# Altium schematic symbol library AD_Lib.SchLib: 1239 symbols (part 1 of 9)
Pins are listed as number, name and electrical type; pins without a type are passive.

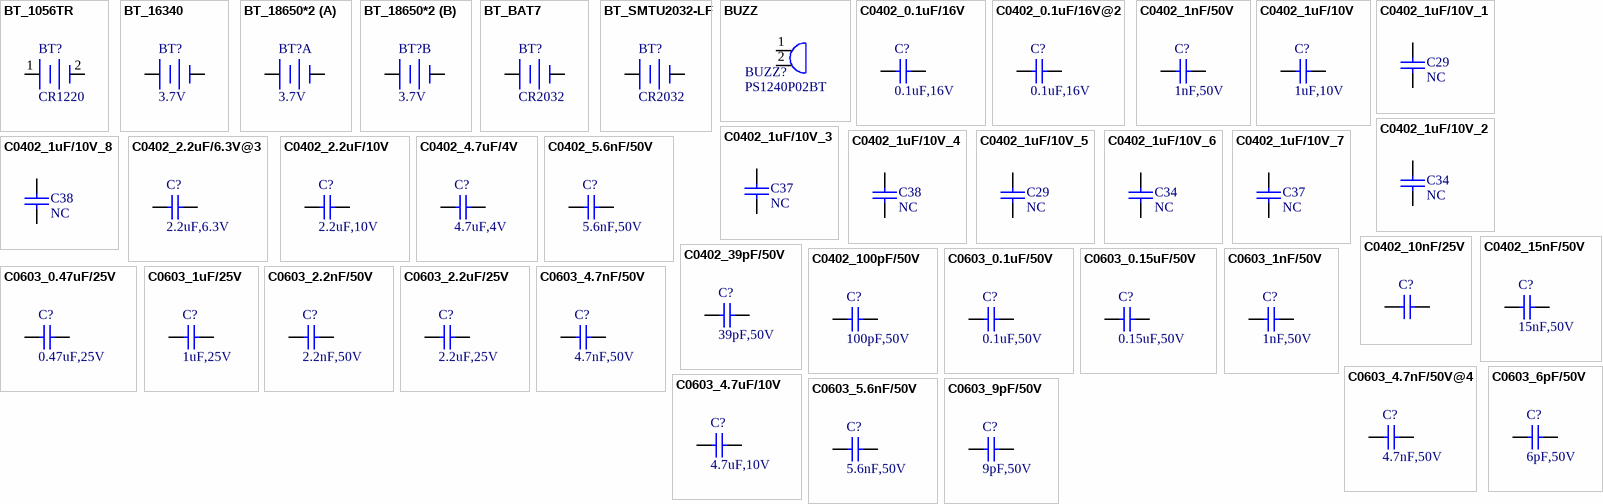
[diagram p0: symbols BT_1056TR to C0603_9pF/50V]

## BT_1056TR
designator BT?, comment CR1220
µç³Ø×ù; CR1220; Manufacturer: Keystone; pro-environment: RoHS; Quality: -40~100¡æ; OPN: 1056TR; other: Æ¥Åäµç³ØÎªCR1220; PadsNum: 2; Value: CR1220; SN: SN; Category: Á¬½ÓÆ÷; Part: 1056TR; QTY: 500; Price: 15.1983; OPN_JLC: 1056TR; SN_JLC: C238068; Price_JLC: 7.638
footprint J_1056TR (ï®µç³Ø»ù×ù£¬¶ÔÓ¦ï®µç³ØCR1220)
pins: 1 +, 2 -
2 alternate drawings of the same symbol

## BT_16340
designator BT?, comment 3.7V
ï®µç³Ø16340;1½Ú;3.7V; pro-environment: RoHS; Quality: -40~100¡æ; OPN: 16340; other: Æ¥Åäµç³ØÎª16340; PadsNum: 2; Value: 3.7V; SN: SN; Category: Á¬½ÓÆ÷; Part: 16340; Price: 3.2; OPN_JLC: OPN_JLC; SN_JLC: SN_JLC; Price_JLC: 0
footprint BT_16340 (16340µç³Ø×ù£¬1½Ú)
pins: 1 +, 2 -
2 alternate drawings of the same symbol

## BT_18650*2
designator BT?, comment 3.7V
ï®µç³Ø18650;2½Ú;3.7V; Manufacturer: ÔÆ»Ô; Part: 18650; pro-environment: RoHS; Quality: -40~100¡æ; OPN: 18650*2; other: Æ¥Åäµç³ØÎª18650; PadsNum: 4; Value: 3.7V; SN: SN; Category: Á¬½ÓÆ÷; Price: 3.2; OPN_JLC: OPN_JLC; SN_JLC: SN_JLC; Price_JLC: 0
footprint BT_18650*2 (Footprint not found)
part A pins: 1 +, 2 -
part B pins: 3 +, 4 -
2 alternate drawings of the same symbol

## BT_BAT7
designator BT?, comment CR2032
µç³Ø×ù; Manufacturer: Renata; pro-environment: RoHS; Quality: -40~100¡æ; SN: 03.4.99.25.99203201S; OPN: SMTU2032-LF; other: Æ¥Åäµç³ØÎªCR2032; PadsNum: 2; Value: CR2032; Category: Á¬½ÓÆ÷; Part: SMTU2032-LF; Price: ?; OPN_JLC: OPN_JLC; SN_JLC: SN_JLC; Price_JLC: 0
footprint SMTU2032-LF (ï®µç³Ø»ù×ù£¬¶ÔÓ¦ï®µç³ØCR2032MFR)
pins: 1 +, 2 -
2 alternate drawings of the same symbol

## BT_SMTU2032-LF
designator BT?, comment CR2032
µç³Ø×ù;CR2032; Manufacturer: Renata; pro-environment: RoHS; Quality: -40~100¡æ; SN: 03.4.99.25.99203201S; OPN: SMTU2032-LF; other: Æ¥Åäµç³ØÎªCR2032; PadsNum: 2; Value: CR2032; Category: Á¬½ÓÆ÷; Part: SMTU2032-LF; Price: ?; OPN_JLC: OPN_JLC; SN_JLC: SN_JLC; Price_JLC: 0
footprint SMTU2032-LF (ï®µç³Ø»ù×ù£¬¶ÔÓ¦ï®µç³ØCR2032MFR)
pins: 1 +, 2 -
2 alternate drawings of the same symbol

## BUZZ
designator BUZZ?, comment PS1240P02BT
PadsNum: 2; OPN: PS1240P02BT; Category: ·äÃùÆ÷; OPN_JLC: OPN_JLC; SN_JLC: SN_JLC; Price_JLC: 0
footprint BUZZ
pins: 1, 2

## C0402_0.1uF/16V
designator C?, comment 0.1uF,16V
ÌùÆ¬µçÈÝ; Manufacturer: Murata; pro-environment: RoHS; Quality: -55~125¡æ; SN: 03.4.37.18.15010402S; other: 0.1uF,16V,10%; OPN: GCM155R71C104KA55D; PadsNum: 2; Category: µçÈÝ; Part: GCM155R71C104KA55D; Value: 0.1uF,16V; QTY: 10000; Price: 0.05031; OPN_JLC: CL05B104KO5NNNC; SN_JLC: C1525; Price_JLC: 0
footprint C0402 (ÌùÆ¬µçÈÝ£¬ÄÍÑ¹10V)
pins: 1, 2

## C0402_0.1uF/16V@2
designator C?, comment 0.1uF,16V
ÌùÆ¬µçÈÝ; Manufacturer: Panasonic; pro-environment: RoHS; Quality: -55~125¡æ; other: 0.1uF,16V,10%; OPN: ???; PadsNum: 2; SN: -; Category: µçÈÝ; Part: ???; Value: 0.1uF,16V; Price: ?; OPN_JLC: CL05B104KO5NNNC; SN_JLC: C1525; Price_JLC: 0
footprint C0402 (ÌùÆ¬µçÈÝ£¬ÄÍÑ¹10V)
pins: 1, 2

## C0402_1nF/50V
designator C?, comment 1nF,50V
ÌùÆ¬µçÈÝ; Manufacturer: Murata; pro-environment: RoHS; Quality: -55~125¡æ; SN: 03.4.37.18.15010201S; other: 1nF,50V,10%; OPN: GCM155R71H102KA37D; PadsNum: 2; Category: µçÈÝ; Part: GCM155R71H102KA37D; Value: 1nF,50V; QTY: 10000; Price: 0.03042; OPN_JLC: 0402B102K500NT; SN_JLC: C1523; Price_JLC: 0
footprint C0402 (ÌùÆ¬µçÈÝ£¬ÄÍÑ¹10V)
pins: 1, 2

## C0402_1uF/10V
designator C?, comment 1uF,10V
ÌùÆ¬µçÈÝ; Manufacturer: Murata; pro-environment: RoHS; Quality: -55~125¡æ; other: 1uF,10V,10%; OPN: GCM155C71A105KE38D; PadsNum: 2; SN: SN; Category: µçÈÝ; Part: GCM155C71A105KE38D; Value: 1uF,10V; QTY: 10000; Price: 0.14577; OPN_JLC: OPN_JLC; SN_JLC: SN_JLC; Price_JLC: 0
footprint C0402 (ÌùÆ¬µçÈÝ£¬ÄÍÑ¹10V)
pins: 1, 2

## C0402_1uF/10V_1
designator C29, comment NC
ÌùÆ¬µçÈÝ; Manufacturer: Murata; pro-environment: RoHS; Quality: -55~125¡æ; other: 1uF,10V,10%; OPN: GCM155C71A105KE38D; SN: SN; Category: µçÈÝ; Part: GCM155C71A105KE38D; Value: NC; QTY: 10000; Price: 0.14577; OPN_JLC: OPN_JLC; SN_JLC: SN_JLC
footprint 0402B
pins: 1, 2

## C0402_1uF/10V_2
designator C34, comment NC
ÌùÆ¬µçÈÝ; Manufacturer: Murata; pro-environment: RoHS; Quality: -55~125¡æ; other: 1uF,10V,10%; OPN: GCM155C71A105KE38D; SN: SN; Category: µçÈÝ; Part: GCM155C71A105KE38D; Value: NC; QTY: 10000; Price: 0.14577; OPN_JLC: OPN_JLC; SN_JLC: SN_JLC
footprint 0402B
pins: 1, 2

## C0402_1uF/10V_3
designator C37, comment NC
ÌùÆ¬µçÈÝ; Manufacturer: Murata; pro-environment: RoHS; Quality: -55~125¡æ; other: 1uF,10V,10%; OPN: GCM155C71A105KE38D; SN: SN; Category: µçÈÝ; Part: GCM155C71A105KE38D; Value: NC; QTY: 10000; Price: 0.14577; OPN_JLC: OPN_JLC; SN_JLC: SN_JLC
footprint 0402B
pins: 1, 2

## C0402_1uF/10V_4
designator C38, comment NC
ÌùÆ¬µçÈÝ; Manufacturer: Murata; pro-environment: RoHS; Quality: -55~125¡æ; other: 1uF,10V,10%; OPN: GCM155C71A105KE38D; SN: SN; Category: µçÈÝ; Part: GCM155C71A105KE38D; Value: NC; QTY: 10000; Price: 0.14577; OPN_JLC: OPN_JLC; SN_JLC: SN_JLC
footprint 0402B
pins: 1, 2

## C0402_1uF/10V_5
designator C29, comment NC
ÌùÆ¬µçÈÝ; Manufacturer: Murata; pro-environment: RoHS; Quality: -55~125¡æ; other: 1uF,10V,10%; OPN: GCM155C71A105KE38D; SN: SN; Category: µçÈÝ; Part: GCM155C71A105KE38D; Value: NC; QTY: 10000; Price: 0.14577; OPN_JLC: OPN_JLC; SN_JLC: SN_JLC
footprint 0402B
pins: 1, 2

## C0402_1uF/10V_6
designator C34, comment NC
ÌùÆ¬µçÈÝ; Manufacturer: Murata; pro-environment: RoHS; Quality: -55~125¡æ; other: 1uF,10V,10%; OPN: GCM155C71A105KE38D; SN: SN; Category: µçÈÝ; Part: GCM155C71A105KE38D; Value: NC; QTY: 10000; Price: 0.14577; OPN_JLC: OPN_JLC; SN_JLC: SN_JLC
footprint 0402B
pins: 1, 2

## C0402_1uF/10V_7
designator C37, comment NC
ÌùÆ¬µçÈÝ; Manufacturer: Murata; pro-environment: RoHS; Quality: -55~125¡æ; other: 1uF,10V,10%; OPN: GCM155C71A105KE38D; SN: SN; Category: µçÈÝ; Part: GCM155C71A105KE38D; Value: NC; QTY: 10000; Price: 0.14577; OPN_JLC: OPN_JLC; SN_JLC: SN_JLC
footprint 0402B
pins: 1, 2

## C0402_1uF/10V_8
designator C38, comment NC
ÌùÆ¬µçÈÝ; Manufacturer: Murata; pro-environment: RoHS; Quality: -55~125¡æ; other: 1uF,10V,10%; OPN: GCM155C71A105KE38D; SN: SN; Category: µçÈÝ; Part: GCM155C71A105KE38D; Value: NC; QTY: 10000; Price: 0.14577; OPN_JLC: OPN_JLC; SN_JLC: SN_JLC
footprint 0402B
pins: 1, 2

## C0402_2.2uF/6.3V@3
designator C?, comment 2.2uF,6.3V
ÌùÆ¬µçÈÝ; Manufacturer: Yageo; pro-environment: RoHS; Quality: -55~85¡æ; SN: 03.4.37.18.15022501S; other: 2.2uF,6.3V,10%; OPN: CC0402KRX5R5BB225; PadsNum: 2; Category: µçÈÝ; Part: CC0402KRX5R5BB225; Value: 2.2uF,6.3V; QTY: 10000; Price: ?; OPN_JLC: OPN_JLC; SN_JLC: SN_JLC; Price_JLC: 0
footprint C0402 (ÌùÆ¬µçÈÝ£¬ÄÍÑ¹10V)
pins: 1, 2

## C0402_2.2uF/10V
designator C?, comment 2.2uF,10V
ÌùÆ¬µçÈÝ; Manufacturer: Murata; pro-environment: RoHS; Quality: -55~125¡æ; SN: 03.4.37.18.15022502S; other: 2.2uF,10V,10%; OPN: GRM155C71A225KE11D; PadsNum: 2; Category: µçÈÝ; Part: GRM155C71A225KE11D; Value: 2.2uF,10V; QTY: 10000; Price: ?; OPN_JLC: OPN_JLC; SN_JLC: SN_JLC; Price_JLC: 0
footprint C0402 (ÌùÆ¬µçÈÝ£¬ÄÍÑ¹10V)
pins: 1, 2

## C0402_4.7uF/4V
designator C?, comment 4.7uF,4V
ÌùÆ¬µçÈÝ; Manufacturer: Murata; pro-environment: RoHS; Quality: -55~125¡æ; other: 4.7uF,4V,20%; OPN: GRM155R60G475ME47D; PadsNum: 2; SN: SN; Category: µçÈÝ; Part: GRM155R60G475ME47D; Value: 4.7uF,4V; QTY: 10000; Price: 0.1695; OPN_JLC: OPN_JLC; SN_JLC: SN_JLC; Price_JLC: 0
footprint C0402 (ÌùÆ¬µçÈÝ£¬ÄÍÑ¹10V)
pins: 1, 2

## C0402_5.6nF/50V
designator C?, comment 5.6nF,50V
ÌùÆ¬µçÈÝ; Manufacturer: Murata; pro-environment: RoHS; Quality: -55~125¡æ; other: 5.6nF,50V,5%; OPN: GCM155R71H562JA55D; PadsNum: 2; SN: SN; Category: µçÈÝ; Part: GCM155R71H562JA55D; Value: 5.6nF,50V; QTY: 10000; Price: 0.06102; OPN_JLC: OPN_JLC; SN_JLC: SN_JLC; Price_JLC: 0
footprint C0402 (ÌùÆ¬µçÈÝ£¬ÄÍÑ¹10V)
pins: 1, 2

## C0402_10nF/25V
designator C?, comment 10nF,25V  (value not drawn)
ÌùÆ¬µçÈÝ; Manufacturer: Murata; pro-environment: RoHS; Quality: -55~125¡æ; SN: 03.4.37.18.15010301S; other: 10nF,25V,10%; OPN: GCM155R71E103KA37D; PadsNum: 2; Category: µçÈÝ; Part: GCM155R71E103KA37D; Value: 10nF,25V; Price: ?; OPN_JLC: CL05B103KB5NNNC; SN_JLC: C15195; Price_JLC: 0
footprint C0402 (ÌùÆ¬µçÈÝ£¬ÄÍÑ¹10V)
pins: 1, 2

## C0402_15nF/50V
designator C?, comment 15nF,50V
ÌùÆ¬µçÈÝ; Manufacturer: Murata; pro-environment: RoHS; Quality: -55~125¡æ; other: 15nF,50V,5%; OPN: GCM155R71H153JA55D; PadsNum: 2; SN: SN; Category: µçÈÝ; Part: GCM155R71H153JA55D; Value: 15nF,50V; QTY: 10000; Price: 0.09266; OPN_JLC: OPN_JLC; SN_JLC: SN_JLC; Price_JLC: 0
footprint C0402 (ÌùÆ¬µçÈÝ£¬ÄÍÑ¹10V)
pins: 1, 2

## C0402_39pF/50V
designator C?, comment 39pF,50V
ÌùÆ¬µçÈÝ; Manufacturer: Murata; pro-environment: RoHS; Quality: -55~125¡æ; other: 39pF,50V,5%; OPN: GCM1555C1H390JA16D; PadsNum: 2; SN: SN; Category: µçÈÝ; Part: GCM1555C1H390JA16D; Value: 39pF,50V; QTY: 10000; Price: 0.08475; OPN_JLC: OPN_JLC; SN_JLC: SN_JLC; Price_JLC: 0
footprint C0402 (ÌùÆ¬µçÈÝ£¬ÄÍÑ¹10V)
pins: 1, 2

## C0402_100pF/50V
designator C?, comment 100pF,50V
ÌùÆ¬µçÈÝ; Manufacturer: Murata; pro-environment: RoHS; Quality: -55~125¡æ; other: 100pF,50V,5%; OPN: GCM1555C1H101JA16D; PadsNum: 2; SN: SN; Category: µçÈÝ; Part: GCM1555C1H101JA16D; Value: 100pF,50V; QTY: 10000; Price: 0.06893; OPN_JLC: OPN_JLC; SN_JLC: SN_JLC; Price_JLC: 0
footprint C0402 (ÌùÆ¬µçÈÝ£¬ÄÍÑ¹10V)
pins: 1, 2

## C0603_0.1uF/50V
designator C?, comment 0.1uF,50V
ÌùÆ¬µçÈÝ; Manufacturer: Murata; pro-environment: RoHS; Quality: -55~125¡æ; other: 0.1uF,50V,10%; OPN: GCM188R71H104KA57D; PadsNum: 2; SN: SN; Category: µçÈÝ; Part: GCM188R71H104KA57D; Value: 0.1uF,50V; QTY: 4000; Price: ?; OPN_JLC: CC0603KRX7R9BB104; SN_JLC: C14663; Price_JLC: 0.014
footprint C0603 (¹«ÖÆ1608£»Ó¢ÖÆ0603)
pins: 1, 2

## C0603_0.15uF/50V
designator C?, comment 0.15uF,50V
ÌùÆ¬µçÈÝ; Manufacturer: Murata; pro-environment: RoHS; Quality: -55~125¡æ; other: 0.15uF,50V,10%; OPN: GCM188R71H154KA64D; PadsNum: 2; SN: SN; Category: µçÈÝ; Part: GCM188R71H154KA64D; Value: 0.15uF,50V; QTY: 4000; Price: 0.2106; OPN_JLC: OPN_JLC; SN_JLC: SN_JLC; Price_JLC: 0
footprint C0603 (¹«ÖÆ1608£»Ó¢ÖÆ0603)
pins: 1, 2

## C0603_0.47uF/25V
designator C?, comment 0.47uF,25V
ÌùÆ¬µçÈÝ; Manufacturer: Murata; pro-environment: RoHS; Quality: -55~125¡æ; other: 0.47uF,25V,10%; OPN: GCM188R71E474KA64D; PadsNum: 2; SN: SN; Category: µçÈÝ; Part: GCM188R71E474KA64D; Value: 0.47uF,25V; QTY: 4000; Price: ?; OPN_JLC: OPN_JLC; SN_JLC: SN_JLC; Price_JLC: 0
footprint C0603 (¹«ÖÆ1608£»Ó¢ÖÆ0603)
pins: 1, 2

## C0603_1nF/50V
designator C?, comment 1nF,50V
ÌùÆ¬µçÈÝ; Manufacturer: Murata; pro-environment: RoHS; Quality: -55~125¡æ; SN: 03.4.37.18.16010204S; other: 1nF,50V,10%; OPN: GCM188R71H102KA37D; PadsNum: 2; Category: µçÈÝ; Part: GCM188R71H102KA37D; Value: 1nF,50V; QTY: 4000; Price: 0.06201; OPN_JLC: CL10B102KB8NNNC; SN_JLC: C1588; Price_JLC: 0
footprint C0603 (¹«ÖÆ1608£»Ó¢ÖÆ0603)
pins: 1, 2

## C0603_1uF/25V
designator C?, comment 1uF,25V
ÌùÆ¬µçÈÝ; Manufacturer: Murata; pro-environment: RoHS; Quality: -55~125¡æ; other: 1uF,25V,10%; OPN: GCM188R71E105KA64D; PadsNum: 2; SN: SN; Category: µçÈÝ; Part: GCM188R71E105KA64D; Value: 1uF,25V; QTY: 4000; Price: ?; OPN_JLC: CL10A105KB8NNNC; SN_JLC: C15849; Price_JLC: 0
footprint C0603 (¹«ÖÆ1608£»Ó¢ÖÆ0603)
pins: 1, 2

## C0603_2.2nF/50V
designator C?, comment 2.2nF,50V
ÌùÆ¬µçÈÝ; Manufacturer: Murata; pro-environment: RoHS; Quality: -55~125¡æ; SN: 03.4.37.18.16022202S; other: 2.2nF,50V,10%; OPN: GCM188R71H222KA37D; PadsNum: 2; Category: µçÈÝ; Part: GCM188R71H222KA37D; Value: 2.2nF,50V; QTY: 4000; Price: 0.03861; OPN_JLC: 0603B222K500NT; SN_JLC: C1604; Price_JLC: 0
footprint C0603 (¹«ÖÆ1608£»Ó¢ÖÆ0603)
pins: 1, 2

## C0603_2.2uF/25V
designator C?, comment 2.2uF,25V
ÌùÆ¬µçÈÝ; Manufacturer: Murata; pro-environment: RoHS; Quality: -55~125¡æ; SN: 03.4.37.18.16022502S; other: 2.2uF,25V,10%; OPN: GRM188C71E225KE11D; PadsNum: 2; Category: µçÈÝ; Part: GRM188C71E225KE11D; Value: 2.2uF,25V; QTY: 4000; Price: -; OPN_JLC: CL10A225KO8NNNC; SN_JLC: C23630; Price_JLC: 0.03206
footprint C0603 (¹«ÖÆ1608£»Ó¢ÖÆ0603)
pins: 1, 2

## C0603_4.7nF/50V
designator C?, comment 4.7nF,50V
ÌùÆ¬µçÈÝ; Manufacturer: Murata; pro-environment: RoHS; Quality: -55~125¡æ; other: 4.7nF,50V,10%; OPN: GCM188R71H472KA37D; PadsNum: 2; SN: SN; Category: µçÈÝ; Part: GCM188R71H472KA37D; Value: 4.7nF,50V; QTY: 5000; Price: ?; OPN_JLC: 0603B472K500NT; SN_JLC: C53987; Price_JLC: 0
footprint C0603 (¹«ÖÆ1608£»Ó¢ÖÆ0603)
pins: 1, 2

## C0603_4.7nF/50V@4
designator C?, comment 4.7nF,50V
ÌùÆ¬µçÈÝ; Manufacturer: AVX; pro-environment: RoHS; Quality: -55~125¡æ; other: 4.7nF,50V,5%,X7R; OPN: 06035C472JAT2A; PadsNum: 2; SN: SN; Category: µçÈÝ; Part: 06035C472JAT2A; Value: 4.7nF,50V; QTY: 4000; Price: 0.18486; OPN_JLC: 0603B472K500NT; SN_JLC: C53987; Price_JLC: 0
footprint C0603 (¹«ÖÆ1608£»Ó¢ÖÆ0603)
pins: 1, 2

## C0603_4.7uF/10V
designator C?, comment 4.7uF,10V
ÌùÆ¬µçÈÝ; Manufacturer: Yageo; pro-environment: RoHS; Quality: -55~125¡æ; other: 4.7uF,6.3V,10%; OPN: GRM188Z71A475KE15J; PadsNum: 2; SN: SN; Category: µçÈÝ; Part: GRM188Z71A475KE15J; Value: 4.7uF,10V; QTY: 4000; Price: 0.47121; OPN_JLC: CL10A475KP8NNNC; SN_JLC: C1705; Price_JLC: 0.027966
footprint C0603 (¹«ÖÆ1608£»Ó¢ÖÆ0603)
pins: 1, 2

## C0603_5.6nF/50V
designator C?, comment 5.6nF,50V
ÌùÆ¬µçÈÝ; Manufacturer: Murata; pro-environment: RoHS; Quality: -55~125¡æ; other: 5.6nF,50V,5%,C0G; OPN: GRM1885C1H562JA01D; PadsNum: 2; SN: SN; Category: µçÈÝ; Part: GRM1885C1H562JA01D; Value: 5.6nF,50V; QTY: 4000; Price: 0.038139; OPN_JLC: CC0603KRX7R9BB562; SN_JLC: C107095; Price_JLC: 0.022469
footprint C0603 (¹«ÖÆ1608£»Ó¢ÖÆ0603)
pins: 1, 2

## C0603_6pF/50V
designator C?, comment 6pF,50V
ÌùÆ¬µçÈÝ; Manufacturer: Murata; pro-environment: RoHS; Quality: -55~125¡æ; other: 6pF,50V,5%; OPN: GCM1885C1H6R0CA16D; PadsNum: 2; SN: SN; Category: µçÈÝ; Part: GCM1885C1H6R0CA16D; Value: 6pF,50V; QTY: 4000; Price: 0.062083; OPN_JLC: CC0603CRNPO9BN6R0; SN_JLC: C130125; Price_JLC: 0.024606
footprint C0603 (¹«ÖÆ1608£»Ó¢ÖÆ0603)
pins: 1, 2

## C0603_9pF/50V
designator C?, comment 9pF,50V
ÌùÆ¬µçÈÝ; Manufacturer: Murata; pro-environment: RoHS; Quality: -55~125¡æ; SN: 03.4.37.18.1609R001S; other: 9pF,50V,0.5pF; PadsNum: 2; OPN: GCM1885C1H9R0DA16D; Category: µçÈÝ; Part: GCM1885C1H9R0DA16D; Value: 9pF,50V; QTY: 4000; Price: ?; OPN_JLC: OPN_JLC; SN_JLC: SN_JLC; Price_JLC: 0
footprint C0603 (¹«ÖÆ1608£»Ó¢ÖÆ0603)
pins: 1, 2

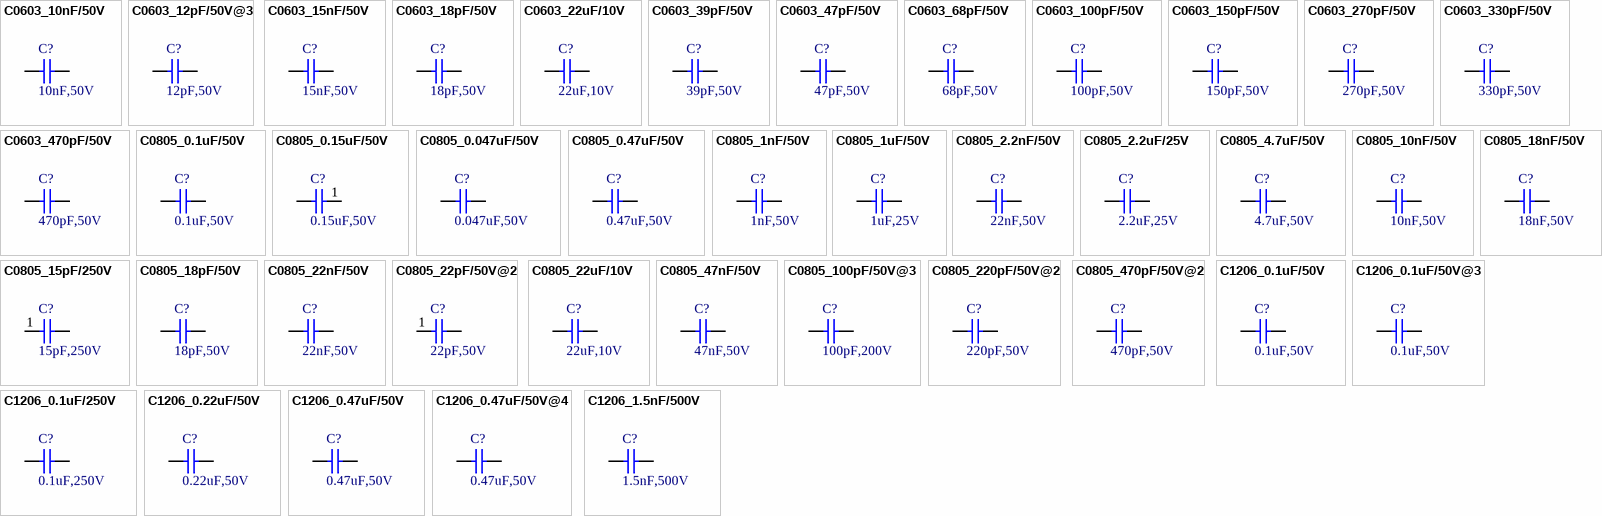
[diagram p1: symbols C0603_10nF/50V to C1206_1.5nF/500V]

## C0603_10nF/50V
designator C?, comment 10nF,50V
ÌùÆ¬µçÈÝ; Manufacturer: Murata; pro-environment: RoHS; Quality: -55~125¡æ; SN: 03.4.37.18.16010306S; other: 10nF,50V,10%; OPN: GCM188R71H103KA37D; PadsNum: 2; Category: µçÈÝ; Part: GCM188R71H103KA37D; Value: 10nF,50V; QTY: 4000; Price: ?; OPN_JLC: 0603B103K500NT; SN_JLC: C57112; Price_JLC: 0
footprint C0603 (¹«ÖÆ1608£»Ó¢ÖÆ0603)
pins: 1, 2

## C0603_12pF/50V@3
designator C?, comment 12pF,50V
ÌùÆ¬µçÈÝ; Manufacturer: Yageo; pro-environment: RoHS; Quality: -25~125¡æ; SN: 03.4.37.18.18012001S; other: 12pF,50V,2%; OPN: CC0603GRNPO9BN120; PadsNum: 2; Category: µçÈÝ; Part: CC0603GRNPO9BN120; Value: 12pF,50V; QTY: 4000; Price: 0.07254; OPN_JLC: CL10C120JB8NNNC; SN_JLC: C38523; Price_JLC: 0
footprint C0603 (¹«ÖÆ1608£»Ó¢ÖÆ0603)
pins: 1, 2

## C0603_15nF/50V
designator C?, comment 15nF,50V
ÌùÆ¬µçÈÝ; Manufacturer: Yageo; pro-environment: RoHS; Quality: -55~125¡æ; other: 15nF,50V,10%; OPN: CC0603KRX7R9BB153; PadsNum: 2; SN: SN; Category: µçÈÝ; Part: CC0603KRX7R9BB153; Value: 15nF,50V; QTY: 4000; Price: ?; OPN_JLC: CC0603KRX7R9BB153; SN_JLC: C107076; Price_JLC: 0.037665
footprint C0603 (¹«ÖÆ1608£»Ó¢ÖÆ0603)
pins: 1, 2

## C0603_18pF/50V
designator C?, comment 18pF,50V
ÌùÆ¬µçÈÝ; Manufacturer: Murata; pro-environment: RoHS; Quality: -55~125¡æ; other: 18pF,50V,1%; PadsNum: 2; OPN: GCM1885C1H180JA14D; SN: SN; Category: µçÈÝ; Part: GCM1885C1H180JA14D; Value: 18pF,50V; QTY: 4000; Price: -; OPN_JLC: CL10C180JB8NNNC; SN_JLC: C1647; Price_JLC: 0.033601
footprint C0603 (¹«ÖÆ1608£»Ó¢ÖÆ0603)
pins: 1, 2

## C0603_22uF/10V
designator C?, comment 22uF,10V
ÌùÆ¬µçÈÝ; Manufacturer: Murata; pro-environment: RoHS; Quality: -55~125¡æ; other: 22uF,10V,20%; OPN: GRM188R61A226ME15D; PadsNum: 2; SN: SN; Category: µçÈÝ; Part: GRM188R61A226ME15D; Value: 22uF,10V; QTY: 4000; Price: 0.162748; OPN_JLC: CL10A226MQ8NRNC; SN_JLC: C59461; Price_JLC: 0.071211
footprint C0603 (¹«ÖÆ1608£»Ó¢ÖÆ0603)
pins: 1, 2

## C0603_39pF/50V
designator C?, comment 39pF,50V
ÌùÆ¬µçÈÝ; Manufacturer: Murata; pro-environment: RoHS; Quality: -55~125¡æ; other: 39pF,50V,5%; OPN: GCM1885C1H390JA16D; PadsNum: 2; SN: SN; Category: µçÈÝ; Part: GCM1885C1H390JA16D; Value: 39pF,50V; QTY: 4000; Price: 0.07281; OPN_JLC: CC0603JRNPO9BN390; SN_JLC: C107049; Price_JLC: 0.013873
footprint C0603 (¹«ÖÆ1608£»Ó¢ÖÆ0603)
pins: 1, 2

## C0603_47pF/50V
designator C?, comment 47pF,50V
ÌùÆ¬µçÈÝ; Manufacturer: Murata; pro-environment: RoHS; Quality: -55~125¡æ; other: 47pF,50V,1%; PadsNum: 2; OPN: GQM1885C1H470FB01D; SN: SN; Category: µçÈÝ; Part: GQM1885C1H470FB01D; Value: 47pF,50V; QTY: 4000; Price: ?; OPN_JLC: CL10C470JB8NNNC; SN_JLC: C1671; Price_JLC: 0
footprint C0603 (¹«ÖÆ1608£»Ó¢ÖÆ0603)
pins: 1, 2

## C0603_68pF/50V
designator C?, comment 68pF,50V
ÌùÆ¬µçÈÝ; Manufacturer: Murata; pro-environment: RoHS; Quality: -25~125¡æ; SN: 03.4.37.18.16068002S; other: 68pF,50V,5%; OPN: GCM1885C1H680JA16D; PadsNum: 2; Category: µçÈÝ; Part: GCM1885C1H680JA16D; Value: 68pF,50V; QTY: 4000; Price: ?; OPN_JLC: CL10C680JB8NNNC; SN_JLC: C28262; Price_JLC: 0
footprint C0603 (¹«ÖÆ1608£»Ó¢ÖÆ0603)
pins: 1, 2

## C0603_100pF/50V
designator C?, comment 100pF,50V
ÌùÆ¬µçÈÝ; Manufacturer: Yageo; pro-environment: RoHS; Quality: -55~125¡æ; other: 100pF,50V,5%; OPN: CC0603JRNPO9BN101; PadsNum: 2; SN: SN; Category: µçÈÝ; Part: CC0603JRNPO9BN101; Value: 100pF,50V; QTY: 4000; Price: 0.011611; OPN_JLC: CC0603JRNPO9BN101; SN_JLC: C14665; Price_JLC: 0.011611
footprint C0603 (¹«ÖÆ1608£»Ó¢ÖÆ0603)
pins: 1, 2

## C0603_150pF/50V
designator C?, comment 150pF,50V
ÌùÆ¬µçÈÝ; Manufacturer: Yageo; pro-environment: RoHS; Quality: -55~125¡æ; SN: 03.4.37.18.16015101S; other: 150pF,50V,10%; OPN: CC0603KRX7R9BB151; PadsNum: 2; Category: µçÈÝ; Part: CC0603KRX7R9BB151; Value: 150pF,50V; QTY: 4000; Price: 0.12168; OPN_JLC: 0603B151K500NT; SN_JLC: C1594; Price_JLC: 0
footprint C0603 (¹«ÖÆ1608£»Ó¢ÖÆ0603)
pins: 1, 2

## C0603_270pF/50V
designator C?, comment 270pF,50V
ÌùÆ¬µçÈÝ; Manufacturer: Murata; pro-environment: RoHS; Quality: -55~125¡æ; other: 270pF,50V,5%; OPN: GCM1885C1H271JA16D; PadsNum: 2; SN: SN; Category: µçÈÝ; Part: GCM1885C1H271JA16D; Value: 270pF,50V; QTY: 4000; Price: 0.22347; OPN_JLC: OPN_JLC; SN_JLC: SN_JLC; Price_JLC: 0
footprint C0603 (¹«ÖÆ1608£»Ó¢ÖÆ0603)
pins: 1, 2

## C0603_330pF/50V
designator C?, comment 330pF,50V
ÌùÆ¬µçÈÝ; Manufacturer: Murata; pro-environment: RoHS; Quality: -55~125¡æ; other: 330pF,50V,10%; OPN: GCM188R11H331KD01D; PadsNum: 2; SN: SN; Category: µçÈÝ; Part: GCM188R11H331KD01D; Value: 330pF,50V; QTY: 4000; Price: ?; OPN_JLC: CL10C331JB8NNNC; SN_JLC: C1664; Price_JLC: 0
footprint C0603 (¹«ÖÆ1608£»Ó¢ÖÆ0603)
pins: 1, 2

## C0603_470pF/50V
designator C?, comment 470pF,50V
ÌùÆ¬µçÈÝ; Manufacturer: Murata; pro-environment: RoHS; Quality: -55~125¡æ; SN: 03.4.37.18.16047101S; other: 470pF,50V,5%; OPN: GCM1882C1H471JA01D; PadsNum: 2; Category: µçÈÝ; Part: GCM1882C1H471JA01D; Value: 470pF,50V; QTY: 4000; Price: 0.06903; OPN_JLC: 0603B471K500NT; SN_JLC: C1620; Price_JLC: 0
footprint C0603 (¹«ÖÆ1608£»Ó¢ÖÆ0603)
pins: 1, 2

## C0805_0.1uF/50V
designator C?, comment 0.1uF,50V
ÌùÆ¬µçÈÝ; Manufacturer: Murata; pro-environment: RoHS; Quality: -55~125¡æ; other: 0.1uF,50V,10%,X7R; OPN: GCM21BR71H104KA37L; PadsNum: 2; SN: SN; Category: µçÈÝ; Part: GCM21BR71H104KA37L; Value: 0.1uF,50V; QTY: 3000; Price: 0.22374; OPN_JLC: CC0805KRX7R9BB104; SN_JLC: C49678; Price_JLC: 0.024601
footprint C0805 (¹«ÖÆ2012£»Ó¢ÖÆ0805)
pins: 1, 2

## C0805_0.15uF/50V
designator C?, comment 0.15uF,50V
ÌùÆ¬µçÈÝ; Manufacturer: Murata; pro-environment: RoHS; Quality: -55~125¡æ; SN: 03.4.37.18.17015401S; other: 0.15uF,50V,10%,X7R; OPN: GCM21BR71H154KA37L; PadsNum: 2; Category: µçÈÝ; Part: GCM21BR71H154KA37L; Value: 0.15uF,50V; QTY: 3000; Price: 0.45045; OPN_JLC: OPN_JLC; SN_JLC: SN_JLC; Price_JLC: 0
footprint C0805 (¹«ÖÆ2012£»Ó¢ÖÆ0805)
pins: 1, 2

## C0805_0.047uF/50V
designator C?, comment 0.047uF,50V
ÌùÆ¬µçÈÝ; Manufacturer: Murata; pro-environment: RoHS; Quality: -55~125¡æ; SN: 03.4.37.18.17047304S; other: 0.047uF,50V,10%; OPN: GCM21BR71H473KA37L; PadsNum: 2; Category: µçÈÝ; Part: GCM21BR71H473KA37L; Value: 0.047uF,50V; Price: ?; OPN_JLC: CL21B473KBCNNNC; SN_JLC: C53134; Price_JLC: 0
footprint C0805 (¹«ÖÆ2012£»Ó¢ÖÆ0805)
pins: 1, 2

## C0805_0.47uF/50V
designator C?, comment 0.47uF,50V
ÌùÆ¬µçÈÝ; Manufacturer: Murata; pro-environment: RoHS; Quality: -55~125¡æ; SN: 03.4.37.18.17047402S; other: 0.47uF,50V,10%; OPN: GCM21BR71H474KA55L; PadsNum: 2; Category: µçÈÝ; Part: GCM21BR71H474KA55L; Value: 0.47uF,50V; Price: ?; OPN_JLC: CL21B474KBFNNNE; SN_JLC: C13967; Price_JLC: 0
footprint C0805 (¹«ÖÆ2012£»Ó¢ÖÆ0805)
pins: 1, 2

## C0805_1nF/50V
designator C?, comment 1nF,50V
ÌùÆ¬µçÈÝ; Manufacturer: AVX; pro-environment: RoHS; Quality: -55~125¡æ; other: 1nF,50V,10%,NP0; OPN: 08055A102JAT2A; PadsNum: 2; SN: SN; Category: µçÈÝ; Part: 08055A102JAT2A; Value: 1nF,50V; QTY: 4000; Price: 0.10881; OPN_JLC: CL21B102KBCNNNC; SN_JLC: C46653; Price_JLC: 0
footprint C0805 (¹«ÖÆ2012£»Ó¢ÖÆ0805)
pins: 1, 2

## C0805_1uF/50V
designator C?, comment 1uF,25V
ÌùÆ¬µçÈÝ; Manufacturer: Murata; pro-environment: RoHS; Quality: -55~125¡æ; SN: 03.4.37.18.17010501S; other: 1uF,25V,10%; OPN: GCM21BR71E105KA56L; PadsNum: 2; Category: µçÈÝ; Part: GCM21BR71E105KA56L; Value: 1uF,25V; QTY: 3000; Price: 0.26208; OPN_JLC: CL21B105KBFNNNE; SN_JLC: C28323; Price_JLC: 0
footprint C0805 (¹«ÖÆ2012£»Ó¢ÖÆ0805)
pins: 1, 2

## C0805_2.2nF/50V
designator C?, comment 22nF,50V
ÌùÆ¬µçÈÝ; Manufacturer: Yageo; pro-environment: RoHS; Quality: -55~125¡æ; other: 2.2uF,50V,10%; OPN: CC0805KRX7R9BB222; PadsNum: 2; SN: SN; Category: µçÈÝ; Part: CC0805KRX7R9BB222; Value: 22nF,50V; QTY: 4000; Price: 0.06669; OPN_JLC: CL21C222JBFNNNE; SN_JLC: C28260; Price_JLC: 0
footprint C0805 (¹«ÖÆ2012£»Ó¢ÖÆ0805)
pins: 1, 2

## C0805_2.2uF/25V
designator C?, comment 2.2uF,25V
ÌùÆ¬µçÈÝ; Manufacturer: Murata; pro-environment: RoHS; Quality: -55~125¡æ; SN: 03.4.37.18.17022501S; other: 2.2uF,25V,10%; OPN: GCM21BR71E225KA73L; PadsNum: 2; Category: µçÈÝ; Part: GCM21BR71E225KA73L; Value: 2.2uF,25V; QTY: 3000; Price: 0.59787; OPN_JLC: 0805F225M500NT; SN_JLC: C49217; Price_JLC: 0
footprint C0805 (¹«ÖÆ2012£»Ó¢ÖÆ0805)
pins: 1, 2

## C0805_4.7uF/50V
designator C?, comment 4.7uF,50V
ÌùÆ¬µçÈÝ; Manufacturer: Murata; pro-environment: RoHS; Quality: -55~125¡æ; SN: 03.4.37.18.17047501S; other: 4.7uF,50V,10%; OPN: GRM21BC71H475KE11L; PadsNum: 2; Category: µçÈÝ; Part: GRM21BC71H475KE11L; Value: 4.7uF,50V; QTY: 3000; Price: 0.90558; OPN_JLC: CL21A475KAQNNNE; SN_JLC: C1779; Price_JLC: 0
footprint C0805 (¹«ÖÆ2012£»Ó¢ÖÆ0805)
pins: 1, 2

## C0805_10nF/50V
designator C?, comment 10nF,50V
ÌùÆ¬µçÈÝ; Manufacturer: Murata; pro-environment: RoHS; Quality: -55~125¡æ; other: 10nF,50V,10%; OPN: GCJ216R71H103KA01D; PadsNum: 2; SN: SN; Category: µçÈÝ; Part: GCJ216R71H103KA01D; Value: 10nF,50V; Price: ?; OPN_JLC: CL21B103KBANNNC; SN_JLC: C1710; Price_JLC: 0
footprint C0805 (¹«ÖÆ2012£»Ó¢ÖÆ0805)
pins: 1, 2

## C0805_15pF/250V
designator C?, comment 15pF,250V
ÌùÆ¬µçÈÝ; Manufacturer: Murata; pro-environment: RoHS; Quality: -55~125¡æ; SN: 03.7.37.18.17015002S; other: 15pF,250V,5%,C0G; OPN: GRM21A5C2E150JW01D; PadsNum: 2; Category: µçÈÝ; Part: GRM21A5C2E150JW01D; Value: 15pF,250V; QTY: 4000; Price: 0.44226; OPN_JLC: CL21C150JBANNNC; SN_JLC: C1794; Price_JLC: 0
footprint C0805 (¹«ÖÆ2012£»Ó¢ÖÆ0805)
pins: 1, 2

## C0805_18nF/50V
designator C?, comment 18nF,50V
ÌùÆ¬µçÈÝ; Manufacturer: Murata; pro-environment: RoHS; Quality: -55~125¡æ; other: 18nF,50V,5%; OPN: GRM21B5C1H183JA01L; PadsNum: 2; SN: SN; Category: µçÈÝ; Part: GRM21B5C1H183JA01L; Value: 18nF,50V; QTY: 3000; Price: 0.7458; OPN_JLC: OPN_JLC; SN_JLC: SN_JLC; Price_JLC: 0
footprint C0805 (¹«ÖÆ2012£»Ó¢ÖÆ0805)
pins: 1, 2

## C0805_18pF/50V
designator C?, comment 18pF,50V
18pF/50V; pro-environment: RoHS; Quality: -55~125¡æ; other: 18pF,50V,10%,NP0; PadsNum: 2; SN: SN; Value: 18pF,50V; QTY: 4000; OPN_JLC: CL21B102KBCNNNC; Price_JLC: 0
footprint C0805 (¹«ÖÆ2012£»Ó¢ÖÆ0805)
pins: 1, 2

## C0805_22nF/50V
designator C?, comment 22nF,50V
ÌùÆ¬µçÈÝ; Manufacturer: Murata; pro-environment: RoHS; Quality: -55~150¡æ; other: 22nF,50V,10%; OPN: GCM219R91H223KA37D; PadsNum: 2; SN: SN; Category: µçÈÝ; Part: GCM219R91H223KA37D; Value: 22nF,50V; QTY: 4000; Price: 0.40002; OPN_JLC: OPN_JLC; SN_JLC: SN_JLC; Price_JLC: 0
footprint C0805 (¹«ÖÆ2012£»Ó¢ÖÆ0805)
pins: 1, 2

## C0805_22pF/50V@2
designator C?, comment 22pF,50V
ÌùÆ¬µçÈÝ; Manufacturer: AVX; pro-environment: RoHS; Quality: -55~125¡æ; SN: 03.4.37.18.17022001S; other: 22pF,50V,5%,C0G; OPN: 08055A220JAT2A; PadsNum: 2; Category: µçÈÝ; Part: 08055A220JAT2A; Value: 22pF,50V; QTY: 4000; Price: 0.08892; OPN_JLC: CL21C220JBANNNC; SN_JLC: C1804; Price_JLC: 0
footprint C0805 (¹«ÖÆ2012£»Ó¢ÖÆ0805)
pins: 1, 2

## C0805_22uF/10V
designator C?, comment 22uF,10V
ÌùÆ¬µçÈÝ; Manufacturer: Murata; pro-environment: RoHS; Quality: -55~125¡æ; other: 22uF,10V,20%; OPN: GRM21BC81A226ME44L; PadsNum: 2; SN: SN; Category: µçÈÝ; Part: GRM21BC81A226ME44L; Value: 22uF,10V; QTY: 3000; Price: 1.02943; OPN_JLC: OPN_JLC; SN_JLC: SN_JLC; Price_JLC: 0
footprint C0805 (¹«ÖÆ2012£»Ó¢ÖÆ0805)
pins: 1, 2

## C0805_47nF/50V
designator C?, comment 47nF,50V
ÌùÆ¬µçÈÝ; Manufacturer: Murata; pro-environment: RoHS; Quality: -55~125¡æ; SN: 03.4.37.18.17047304S; other: 47nF,50V,10%; OPN: GCM21BR71H473KA37L; PadsNum: 2; Category: µçÈÝ; Part: GCM21BR71H473KA37L; Value: 47nF,50V; QTY: 3000; Price: 0.234; OPN_JLC: CL21B473KBCNNNC; SN_JLC: C53134; Price_JLC: 0
footprint C0805 (¹«ÖÆ2012£»Ó¢ÖÆ0805)
pins: 1, 2

## C0805_100pF/50V@3
designator C?, comment 100pF,200V
ÌùÆ¬µçÈÝ; Manufacturer: Yageo; pro-environment: RoHS; Quality: -55~125¡æ; SN: 03.4.37.18.17010101S; other: 100pF,200V,5%,NPO; OPN: CC0805JRNPOABN101; PadsNum: 2; Category: µçÈÝ; Part: CC0805JRNPOABN101; Value: 100pF,200V; QTY: 4000; Price: 0.20007; OPN_JLC: CL21C101JBANNNC; SN_JLC: C1790; Price_JLC: 0
footprint C0805 (¹«ÖÆ2012£»Ó¢ÖÆ0805)
pins: 1, 2

## C0805_220pF/50V@2
designator C?, comment 220pF,50V
ÌùÆ¬µçÈÝ; Manufacturer: AVX; pro-environment: RoHS; Quality: -55~125¡æ; SN: 03.4.37.18.17022101S; other: 220pF,50V,5%,NPO; OPN: 08055A221JAT2A; PadsNum: 2; Category: µçÈÝ; Part: 08055A221JAT2A; Value: 220pF,50V; QTY: 4000; Price: 0.14625; OPN_JLC: CL21B221KBANNNC; SN_JLC: C53172; Price_JLC: 0
footprint C0805 (¹«ÖÆ2012£»Ó¢ÖÆ0805)
pins: 1, 2

## C0805_470pF/50V@2
designator C?, comment 470pF,50V
ÌùÆ¬µçÈÝ; Manufacturer: AVX; pro-environment: RoHS; Quality: -55~125¡æ; SN: 03.4.37.18.17047101S; other: 470pF,50V,5%,C0G; OPN: 08055A471JAT2A; PadsNum: 2; Category: µçÈÝ; Part: 08055A471JAT2A; Value: 470pF,50V; QTY: 4000; Price: 0.14157; OPN_JLC: 0805B471K500NT; SN_JLC: C1743; Price_JLC: 0
footprint C0805 (¹«ÖÆ2012£»Ó¢ÖÆ0805)
pins: 1, 2

## C1206_0.1uF/50V
designator C?, comment 0.1uF,50V
ÌùÆ¬µçÈÝ; Manufacturer: Murata; pro-environment: RoHS; Quality: -55~125¡æ; other: 0.1uF,50V,10%; OPN: GCM319R71H104KA37D; PadsNum: 2; SN: SN; Category: µçÈÝ; Part: GCM319R71H104KA37D; Value: 0.1uF,50V; QTY: 4000; Price: 0.25389; OPN_JLC: CL31B104KBCNNNC; SN_JLC: C24497; Price_JLC: 0
footprint C1206 (¹«ÖÆ3216£»Ó¢ÖÆ1206£»)
pins: 1, 2

## C1206_0.1uF/50V@3
designator C?, comment 0.1uF,50V
ÌùÆ¬µçÈÝ; Manufacturer: Yageo; pro-environment: RoHS; Quality: -55~125¡æ; SN: 03.4.37.18.18010403S; other: 0.1uF,50V,10%; OPN: CC1206KRX7R9BB104; PadsNum: 2; Category: µçÈÝ; Part: CC1206KRX7R9BB104; Value: 0.1uF,50V; Price: ?; OPN_JLC: CL31B104KBCNNNC; SN_JLC: C24497; Price_JLC: 0
footprint C1206 (¹«ÖÆ3216£»Ó¢ÖÆ1206£»)
pins: 1, 2

## C1206_0.1uF/250V
designator C?, comment 0.1uF,250V
ÌùÆ¬µçÈÝ; Manufacturer: Murata; pro-environment: RoHS; Quality: -55~125¡æ; SN: 03.4.37.18.18010404S; other: 0.1uF,250V,10%; OPN: GRM31CR72E104KW03L; PadsNum: 2; Category: µçÈÝ; Part: GRM31CR72E104KW03L; Value: 0.1uF,250V; QTY: 2000; Price: 0.43875; OPN_JLC: OPN_JLC; SN_JLC: SN_JLC; Price_JLC: 0
footprint C1206 (¹«ÖÆ3216£»Ó¢ÖÆ1206£»)
pins: 1, 2

## C1206_0.22uF/50V
designator C?, comment 0.22uF,50V
ÌùÆ¬µçÈÝ; Manufacturer: Murata; pro-environment: RoHS; Quality: -55~125¡æ; other: 0.22uF,50V,10%; OPN: GCM31MR71H224KA37L; PadsNum: 2; SN: SN; Category: µçÈÝ; Part: GCM31MR71H224KA37L; Value: 0.22uF,50V; QTY: 3000; Price: ?; OPN_JLC: 1206B224K500NT; SN_JLC: C1857; Price_JLC: 0
footprint C1206 (¹«ÖÆ3216£»Ó¢ÖÆ1206£»)
pins: 1, 2

## C1206_0.47uF/50V
designator C?, comment 0.47uF,50V
ÌùÆ¬µçÈÝ; Manufacturer: Murata; pro-environment: RoHS; Quality: -55~125¡æ; SN: 03.4.37.18.18047403S; other: 0.47uF,50V,10%; OPN: GCM31MR71H474KA37L; PadsNum: 2; Category: µçÈÝ; Part: GCM31MR71H474KA37L; Value: 0.47uF,50V; QTY: 3000; Price: ?; OPN_JLC: 1206B474K500NT; SN_JLC: C1871; Price_JLC: 0
footprint C1206 (¹«ÖÆ3216£»Ó¢ÖÆ1206£»)
pins: 1, 2

## C1206_0.47uF/50V@4
designator C?, comment 0.47uF,50V
ÌùÆ¬µçÈÝ; Manufacturer: AVX; pro-environment: RoHS; Quality: -55~125¡æ; SN: 03.4.37.18.18047402S; other: 0.47uF,50V,10%; OPN: 12065C474KAT2A; PadsNum: 2; Category: µçÈÝ; Part: 12065C474KAT2A; Value: 0.47uF,50V; QTY: 2000; Price: ?; OPN_JLC: 1206B474K500NT; SN_JLC: C1871; Price_JLC: 0
footprint C1206 (¹«ÖÆ3216£»Ó¢ÖÆ1206£»)
pins: 1, 2

## C1206_1.5nF/500V
designator C?, comment 1.5nF,500V
ÌùÆ¬µçÈÝ; Manufacturer: Murata; pro-environment: RoHS; Quality: -55~125¡æ; other: 1.5nF,500V,5%; OPN: GRM31A7U2H152JW31D; PadsNum: 2; SN: SN; Category: µçÈÝ; Part: GRM31A7U2H152JW31D; Value: 1.5nF,500V; QTY: 4000; Price: 0.65314; OPN_JLC: CC1206JRNPOBBN152; SN_JLC: C326591; Price_JLC: 0.162841
footprint C1206 (¹«ÖÆ3216£»Ó¢ÖÆ1206£»)
pins: 1, 2

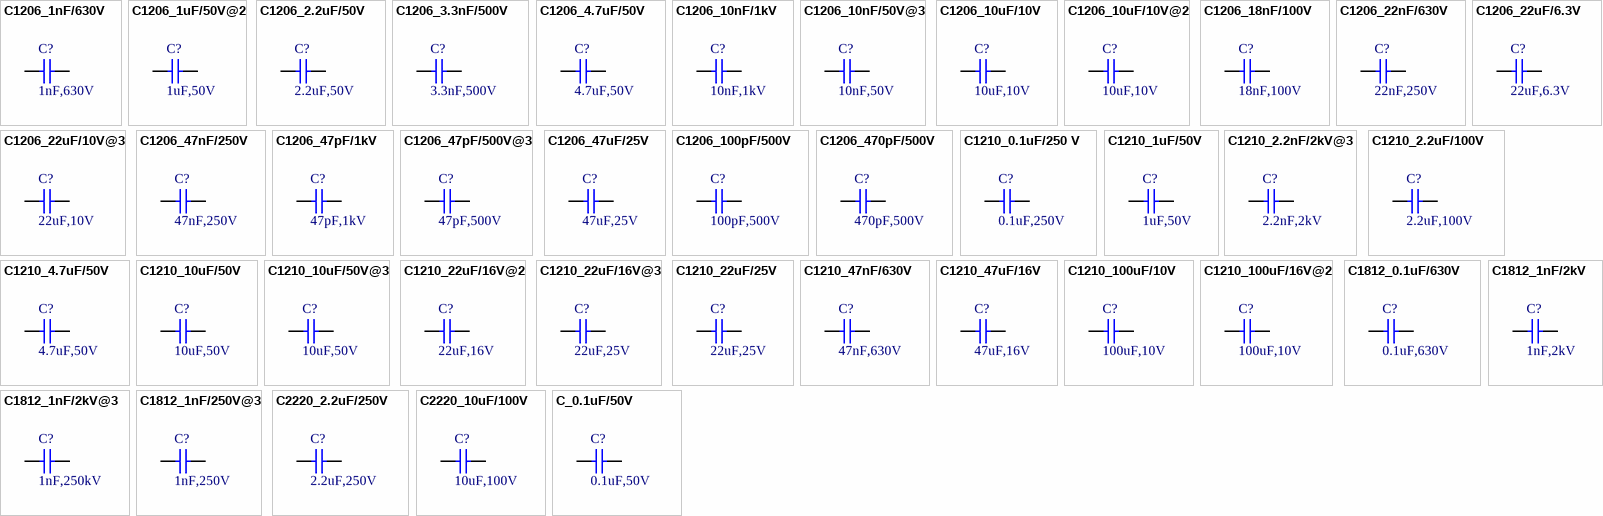
[diagram p2: symbols C1206_1nF/630V to C_0.1uF/50V]

## C1206_1nF/630V
designator C?, comment 1nF,630V
ÌùÆ¬µçÈÝ; Manufacturer: Murata; pro-environment: RoHS; Quality: -55~125¡æ; SN: 03.4.37.18.18010203S; other: 1nF,630V,10%; OPN: GCJ31BR72J102KXJ1L; PadsNum: 2; Category: µçÈÝ; Part: GCJ31BR72J102KXJ1L; Value: 1nF,630V; QTY: 3000; Price: 0.68562; OPN_JLC: CL31B102KGFNNNE; SN_JLC: C35216; Price_JLC: 0
footprint C1206 (¹«ÖÆ3216£»Ó¢ÖÆ1206£»)
pins: 1, 2

## C1206_1uF/50V@2
designator C?, comment 1uF,50V
ÌùÆ¬µçÈÝ; Manufacturer: AVX; pro-environment: RoHS; Quality: -55~125¡æ; SN: 03.4.37.18.18010502S; other: 1uF,50V,10%; OPN: 12065C105KAT2A; PadsNum: 2; Category: µçÈÝ; Part: 12065C105KAT2A; Value: 1uF,50V; QTY: 2000; Price: 1.9539; OPN_JLC: CL31B105KBHNNNE; SN_JLC: C1848; Price_JLC: 0
footprint C1206 (¹«ÖÆ3216£»Ó¢ÖÆ1206£»)
pins: 1, 2

## C1206_2.2uF/50V
designator C?, comment 2.2uF,50V
ÌùÆ¬µçÈÝ; Manufacturer: Murata; pro-environment: RoHS; Quality: -55~125¡æ; other: 2.2uF,50V,10%; OPN: GCM31CR71H225KA55L; PadsNum: 2; SN: SN; Category: µçÈÝ; Part: GCM31CR71H225KA55L; Value: 2.2uF,50V; QTY: 2000; Price: 0.585; OPN_JLC: CL31B225KBHNNNE; SN_JLC: C50254; Price_JLC: 0.183354
footprint C1206 (¹«ÖÆ3216£»Ó¢ÖÆ1206£»)
pins: 1, 2

## C1206_3.3nF/500V
designator C?, comment 3.3nF,500V
ÌùÆ¬µçÈÝ; Manufacturer: Murata; pro-environment: RoHS; Quality: -55~125¡æ; other: 3.3nF,500V,5%; OPN: GRM31B7U2H332JW31L; PadsNum: 2; SN: SN; Category: µçÈÝ; Part: GRM31B7U2H332JW31L; Value: 3.3nF,500V; QTY: 3000; Price: 0.82942; OPN_JLC: 1206B332K102NT; SN_JLC: C9193; Price_JLC: 0.116837
footprint C1206 (¹«ÖÆ3216£»Ó¢ÖÆ1206£»)
pins: 1, 2

## C1206_4.7uF/50V
designator C?, comment 4.7uF,50V
ÌùÆ¬µçÈÝ; Manufacturer: Murata; pro-environment: RoHS; Quality: -55~125¡æ; SN: 03.4.37.18.18047501S; other: 4.7uF,50V,20%; OPN: GRM31CF51H475ZA01L; PadsNum: 2; Category: µçÈÝ; Part: GRM31CF51H475ZA01L; Value: 4.7uF,50V; QTY: 2000; Price: 0.91728; OPN_JLC: 1206B475K500NT; SN_JLC: C29823; Price_JLC: 0
footprint C1206 (¹«ÖÆ3216£»Ó¢ÖÆ1206£»)
pins: 1, 2

## C1206_10nF/1kV
designator C?, comment 10nF,1kV
ÌùÆ¬µçÈÝ; Manufacturer: Murata; pro-environment: RoHS; Quality: -55~125¡æ; SN: 03.4.38.18.18010306S; other: 10nF,1kV,10%; OPN: GCJ31CR73A103KXJ3L; PadsNum: 2; Category: µçÈÝ; Part: GCJ31CR73A103KXJ3L; Value: 10nF,1kV; QTY: 2000; Price: 0.6084; OPN_JLC: OPN_JLC; SN_JLC: SN_JLC; Price_JLC: 0
footprint C1206 (¹«ÖÆ3216£»Ó¢ÖÆ1206£»)
pins: 1, 2

## C1206_10nF/50V@3
designator C?, comment 10nF,50V
ÌùÆ¬µçÈÝ; Manufacturer: Yageo; pro-environment: RoHS; Quality: -55~125¡æ; SN: 03.4.37.18.18010303S; other: 10nF,50V,10%; OPN: CC1206KRX7R9BB103; PadsNum: 2; Category: µçÈÝ; Part: CC1206KRX7R9BB103; Value: 10nF,50V; Price: ?; OPN_JLC: 1206B103K500NT; SN_JLC: C1846; Price_JLC: 0
footprint C1206 (¹«ÖÆ3216£»Ó¢ÖÆ1206£»)
pins: 1, 2

## C1206_10uF/10V
designator C?, comment 10uF,10V
ÌùÆ¬µçÈÝ; Manufacturer: Murata; pro-environment: RoHS; Quality: -55~125¡æ; other: 10uF,10V,10%; OPN: GCM31CR71A106KA64L; PadsNum: 2; SN: SN; Category: µçÈÝ; Part: GCM31CR71A106KA64L; Value: 10uF,10V; QTY: 2000; Price: 0.585; OPN_JLC: CL31A106KBHNNNE; SN_JLC: C13585; Price_JLC: 0.200612
footprint C1206 (¹«ÖÆ3216£»Ó¢ÖÆ1206£»)
pins: 1, 2

## C1206_10uF/10V@2
designator C?, comment 10uF,10V
ÌùÆ¬µçÈÝ; Manufacturer: Panasonic; pro-environment: RoHS; Quality: -55~125¡æ; other: 10uF,10V,10%; OPN: Undefined; PadsNum: 2; SN: SN; Category: µçÈÝ; Value: 10uF,10V; Price: ?; OPN_JLC: CL31A106KBHNNNE; SN_JLC: C13585; Price_JLC: 0
footprint C1206 (¹«ÖÆ3216£»Ó¢ÖÆ1206£»)
pins: 1, 2

## C1206_18nF/100V
designator C?, comment 18nF,100V
ÌùÆ¬µçÈÝ; Manufacturer: Yageo; pro-environment: RoHS; Quality: -55~125¡æ; other: 18nF,100V,10%; OPN: CC1206KRX7R0BB183; PadsNum: 2; SN: SN; Category: µçÈÝ; Part: CC1206KRX7R0BB183; Value: 18nF,100V; QTY: 2000; Price: 0.283898; OPN_JLC: CC1206KRX7R0BB183; SN_JLC: C527345; Price_JLC: 0.283898
footprint C1206 (¹«ÖÆ3216£»Ó¢ÖÆ1206£»)
pins: 1, 2

## C1206_22nF/630V
designator C?, comment 22nF,250V
ÌùÆ¬µçÈÝ; Manufacturer: Murata; pro-environment: RoHS; Quality: -55~125¡æ; other: 22nF,250V,10%; OPN: GCJ31BR72E223KXJ1L; PadsNum: 2; SN: SN; Category: µçÈÝ; Part: GCJ31BR72E223KXJ1L; Value: 22nF,250V; QTY: 3000; Price: ?; OPN_JLC: OPN_JLC; SN_JLC: SN_JLC; Price_JLC: 0
footprint C1206 (¹«ÖÆ3216£»Ó¢ÖÆ1206£»)
pins: 1, 2

## C1206_22uF/6.3V
designator C?, comment 22uF,6.3V
ÌùÆ¬µçÈÝ; Manufacturer: Murata; pro-environment: RoHS; Quality: -55~125¡æ; other: 22uF,6.3V,10%; OPN: GCM31CR70J226KE23L; PadsNum: 2; SN: SN; Category: µçÈÝ; Part: GCM31CR70J226KE23L; Value: 22uF,6.3V; QTY: 2000; Price: -; OPN_JLC: CL10A226MQ8NRNC; SN_JLC: C59461; Price_JLC: 0.057685
footprint C1206 (¹«ÖÆ3216£»Ó¢ÖÆ1206£»)
pins: 1, 2

## C1206_22uF/10V@3
designator C?, comment 22uF,10V
ÌùÆ¬µçÈÝ; Manufacturer: Yageo; pro-environment: RoHS; Quality: -55~80¡æ; SN: 03.4.37.18.18022601S; other: 22uF,10V,10%; OPN: CC1206KKX5R6BB226; PadsNum: 2; Category: µçÈÝ; Part: CC1206KKX5R6BB226; Value: 22uF,10V; QTY: 2000; Price: 0.87282; OPN_JLC: OPN_JLC; SN_JLC: SN_JLC; Price_JLC: 0
footprint C1206 (¹«ÖÆ3216£»Ó¢ÖÆ1206£»)
pins: 1, 2

## C1206_47nF/250V
designator C?, comment 47nF,250V
ÌùÆ¬µçÈÝ; Manufacturer: Murata; pro-environment: RoHS; Quality: -55~125¡æ; other: 47nF,250V,10%; OPN: GCJ31CR72E473KXJ3L; PadsNum: 2; SN: SN; Category: µçÈÝ; Part: GCJ31CR72E473KXJ3L; Value: 47nF,250V; QTY: 2000; Price: 0.76986; OPN_JLC: OPN_JLC; SN_JLC: SN_JLC; Price_JLC: 0
footprint C1206 (¹«ÖÆ3216£»Ó¢ÖÆ1206£»)
pins: 1, 2

## C1206_47pF/1kV
designator C?, comment 47pF,1kV
ÌùÆ¬µçÈÝ; Manufacturer: Murata; pro-environment: RoHS; Quality: -55~125¡æ; other: 47pF,1kV,10%; OPN: GRM31A5C3A470JW01D; PadsNum: 2; SN: SN; Category: µçÈÝ; Part: GRM31A5C3A470JW01D; Value: 47pF,1kV; QTY: 4000; Price: ?; OPN_JLC: OPN_JLC; SN_JLC: SN_JLC; Price_JLC: 0
footprint C1206 (¹«ÖÆ3216£»Ó¢ÖÆ1206£»)
pins: 1, 2

## C1206_47pF/500V@3
designator C?, comment 47pF,500V
ÌùÆ¬µçÈÝ; Manufacturer: Yageo; Part: CC1206JRNPOBBN470; pro-environment: RoHS; Quality: -55~125¡æ; SN: 03.4.37.18.18047002S; other: 47pF,500V,5%; OPN: CC1206JRNPO9BN470; PadsNum: 2; Category: µçÈÝ; Value: 47pF,500V; QTY: 4000; Price: 0.2925; OPN_JLC: OPN_JLC; SN_JLC: SN_JLC; Price_JLC: 0
footprint C1206 (¹«ÖÆ3216£»Ó¢ÖÆ1206£»)
pins: 1, 2

## C1206_47uF/25V
designator C?, comment 47uF,25V
ÌùÆ¬µçÈÝ; Manufacturer: Murata; pro-environment: RoHS; Quality: -55~80¡æ; other: 47uF,25V,20%; OPN: GRM31CR61E476ME44L; PadsNum: 2; SN: SN; Category: µçÈÝ; Part: GRM31CR61E476ME44L; Value: 47uF,25V; QTY: 2000; Price: 1.42; OPN_JLC: GRM31CR61E476ME44L; SN_JLC: C403725; Price_JLC: 1.42
footprint C1206 (¹«ÖÆ3216£»Ó¢ÖÆ1206£»)
pins: 1, 2

## C1206_100pF/500V
designator C?, comment 100pF,500V
ÌùÆ¬µçÈÝ; Manufacturer: Murata; pro-environment: RoHS; Quality: -55~125¡æ; other: 100pF,500V,5%; OPN: GRM31A5C2H101JW01D; PadsNum: 2; SN: SN; Category: µçÈÝ; Part: GRM31A5C2H101JW01D; Value: 100pF,500V; QTY: 4000; Price: 0.5763; OPN_JLC: CC1206JKNPOCBN100; SN_JLC: C107172; Price_JLC: 0.111119
footprint C1206 (¹«ÖÆ3216£»Ó¢ÖÆ1206£»)
pins: 1, 2

## C1206_470pF/500V
designator C?, comment 470pF,500V
ÌùÆ¬µçÈÝ; Manufacturer: Murata; pro-environment: RoHS; Quality: -55~125¡æ; other: 470pF,500V,10%; OPN: GRM31MR72H471KY21L; PadsNum: 2; SN: SN; Category: µçÈÝ; Part: GRM31MR72H471KY21L; Value: 470pF,500V; QTY: 3000; Price: ?; OPN_JLC: 1206B471K500NT; SN_JLC: C1868; Price_JLC: 0
footprint C1206 (¹«ÖÆ3216£»Ó¢ÖÆ1206£»)
pins: 1, 2

## C1210_0.1uF/250 V
designator C?, comment 0.1uF,250V
ÌùÆ¬µçÈÝ; Manufacturer: Murata; pro-environment: RoHS; Quality: -55~125¡æ; SN: 03.4.37.18.19010401S; other: 1uF,200V,10%; OPN: GRM32DR72E104KW01L; PadsNum: 2; Category: µçÈÝ; Part: GRM32DR72E104KW01L; Value: 0.1uF,250V; QTY: 1000; Price: 0.97812; OPN_JLC: OPN_JLC; SN_JLC: SN_JLC; Price_JLC: 0
footprint C1210 (Chip Capacitor; Body 1.2x 1.0 mm (LxW typ))
pins: 1, 2
